# Altium footprint library connectors.PcbLib: 138 footprints (part 8 of 9)
Each footprint in its own frame and in the unit in brackets; x right, y up, seen from the top. Pads: shape width x height; smd on the part's side, far side on the other; paste and mask are expansions set on the pad; w line width, h text height; cw(c..) or ccw(c..) is an arc to the next point about the centre after c.
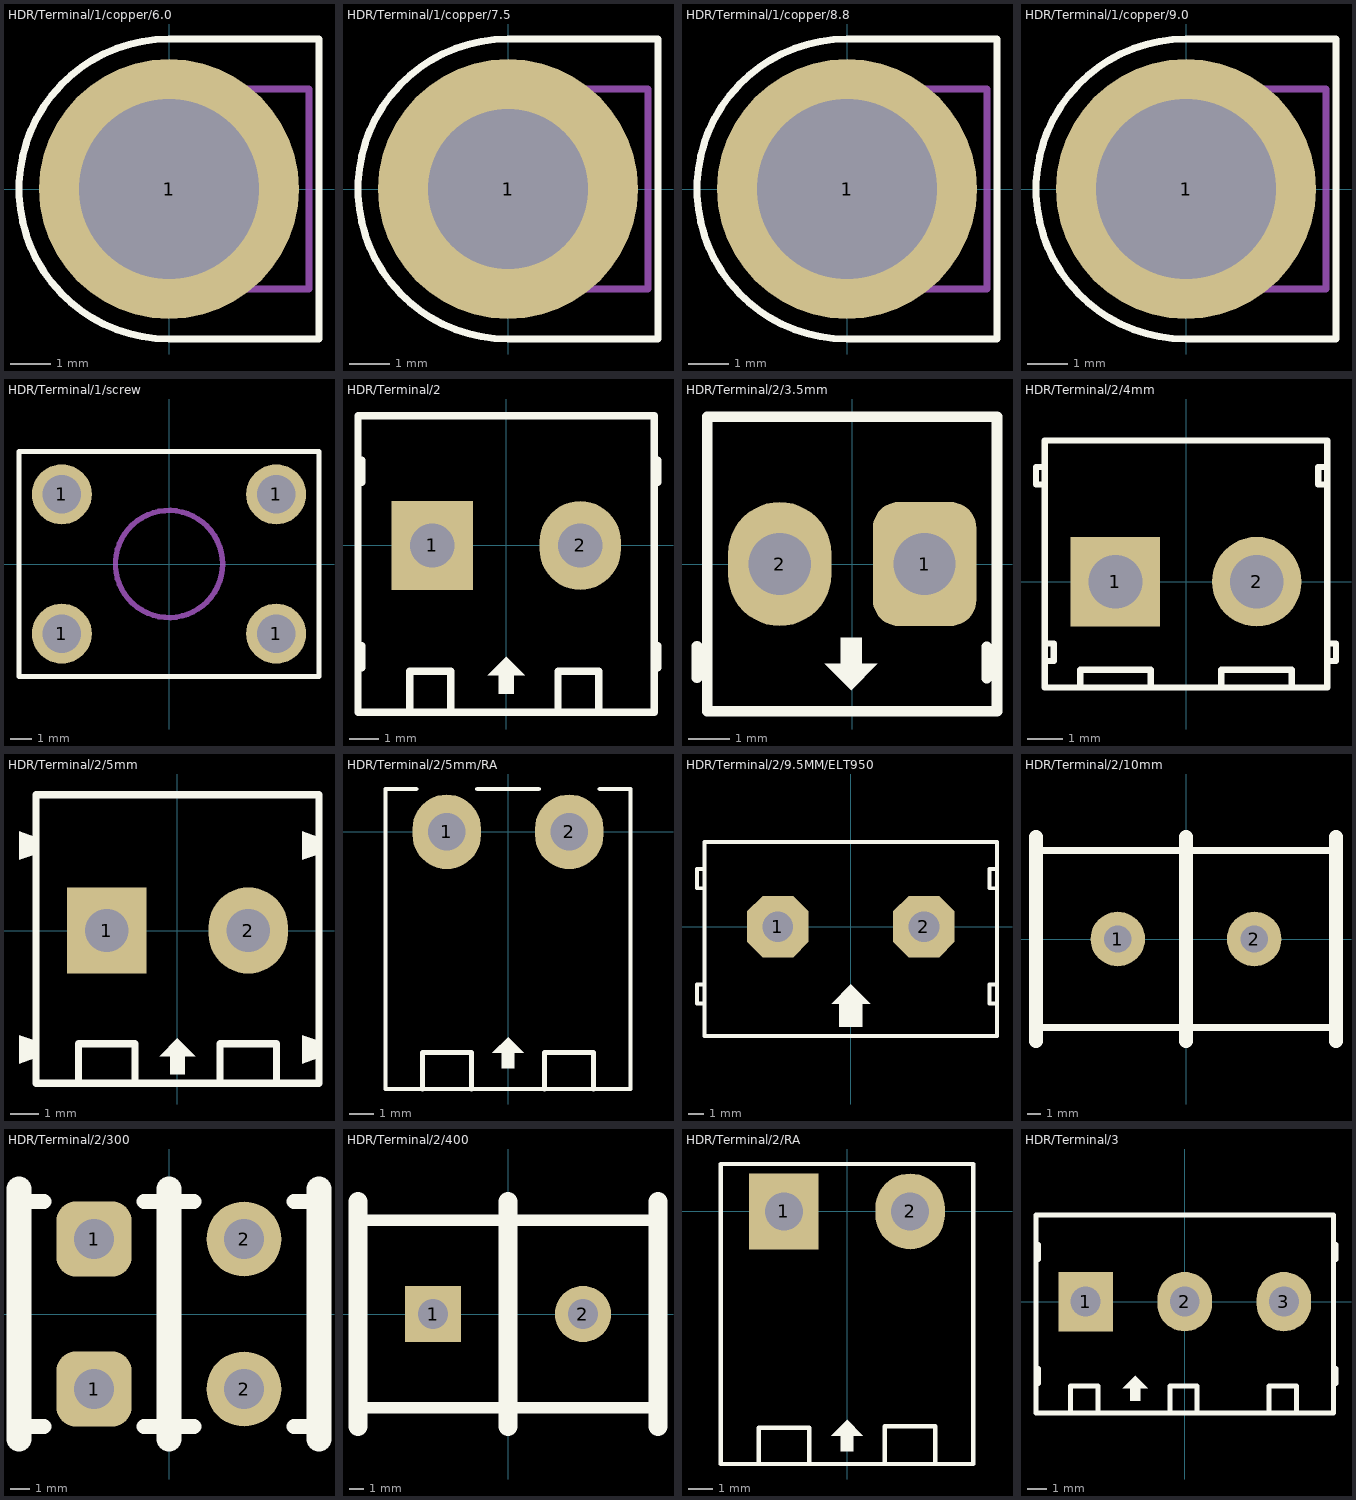
[diagram p7: the footprints below, top view; thin cyan lines are the x and y axes]

## HDR/Terminal/1/copper/6.0 [mm] "Header 1, 1 pin,"
height 7.62
pads (1):
  round 6.5 hole 4.5: 1(0,0)
Top Overlay:
  lines w0.178: 0,-3.75 cw(c0,0) 0,3.75 3.75,3.75 3.75,-3.75 0,-3.75
Mechanical 1:
  lines w0.178: 0.49,-2.451 cw(c0,0) 0.49,2.451 ; 0.5,-2.5 3.5,-2.5 3.5,2.5 0.5,2.5
3D body "terminal2.STEP": height 6, standoff -2, extent -2.5,-2.5 3.5,2.5

## HDR/Terminal/1/copper/7.5 [mm] "Header 1, 1 pin,"
height 7.62
pads (1):
  round 6.5 hole 4: 1(0,0)
Top Overlay:
  lines w0.178: 0,-3.75 cw(c0,0) 0,3.75 3.75,3.75 3.75,-3.75 0,-3.75
Mechanical 1:
  lines w0.178: 0.49,-2.451 cw(c0,0) 0.49,2.451 ; 0.5,-2.5 3.5,-2.5 3.5,2.5 0.5,2.5
3D body "terminal4.STEP": height 7.5, standoff -2, extent -2.5,-2.5 6.5,2.5

## HDR/Terminal/1/copper/8.8 [mm] "Header 1, 1 pin,"
height 7.62
pads (1):
  round 6.5 hole 4.5: 1(0,0)
Top Overlay:
  lines w0.178: 0,-3.75 cw(c0,0) 0,3.75 3.75,3.75 3.75,-3.75 0,-3.75
Mechanical 1:
  lines w0.178: 0.49,-2.451 cw(c0,0) 0.49,2.451 ; 0.5,-2.5 3.5,-2.5 3.5,2.5 0.5,2.5
3D body "terminal3.STEP": height 8.8, standoff -2, extent -2.5,-2.5 3.5,2.5

## HDR/Terminal/1/copper/9.0 [mm] "Header 1, 1 pin,"
height 7.62
pads (1):
  round 6.5 hole 4.5: 1(0,0)
Top Overlay:
  lines w0.178: 0,-3.75 cw(c0,0) 0,3.75 3.75,3.75 3.75,-3.75 0,-3.75
Mechanical 1:
  lines w0.178: 0.49,-2.451 cw(c0,0) 0.49,2.451 ; 0.5,-2.5 3.5,-2.5 3.5,2.5 0.5,2.5
3D body "terminal.STEP": height 9, standoff -2, extent -2.5,-2.5 3.5,2.5

## HDR/Terminal/1/screw [mm]
height 7.62
pads (4):
  round 2.8 hole 1.8: 1(-5,-3.25) 1(-5,3.25) 1(5,-3.25) 1(5,3.25)
Top Overlay:
  lines w0.254: -7,-5.25 -7,5.25 7,5.25 7,-5.25 -7,-5.25
Mechanical 1:
  circle w0.254: c0,0 r2.5
3D body: height 1.5, standoff 0, extent -7,-5.25 -6.25,5.25
3D body: height 4, standoff 0, extent -5.5,-5.25 -4.75,5.25
3D body: height 4, standoff 0, extent -3.75,-5.25 -3,5.25
3D body: height 4, standoff 0, extent -5.375,-5.25 -4.625,5.25
3D body: height 4, standoff 0, extent 4.625,-5.25 5.375,5.25
3D body: height 4.75, standoff 4, extent -5.375,-5.25 0,5.25
3D body: height 4.75, standoff 4, extent 0,-5.25 5.375,5.25

## HDR/Terminal/2 [mil] "Header 2, 2 pin, hight 400mil, Pin to Pin 200mil, Colour Green"
height 300
pads (2):
  rect 110x120 hole 60: 1(-100,0)
  oval 110x120 hole 60: 2(100,0)
Top Overlay:
  region: 0,-150 -25,-175 -10,-175 -10,-200 10,-200 10,-175 25,-175
  lines w10: -195,-165 -195,-135 ; -195,85 -195,115 ; -130,-225 -130,-170 -75,-170 -75,-225 ; 70,-225 70,-170 125,-170 125,-225 ; 205,-165 205,-135 ; 205,85 205,115 ; -200,-225 -200,175 200,175 200,-225 -200,-225
3D body "13989.stp": height 559.05, standoff -137.8, extent -229.17,-217.91 200,167.91

## HDR/Terminal/2/3.5mm [mm]
pads (2):
  rrect50% 2.5x3 hole 1.5: 1(1.75,0)
  oval 2.5x3 hole 1.5: 2(-1.75,0)
Top Overlay:
  region: -0.028,-3.048 0.607,-2.413 0.226,-2.413 0.226,-1.778 -0.282,-1.778 -0.282,-2.413 -0.663,-2.413
  lines w0.254: -3.75,-2.75 -3.75,-1.988 ; 3.25,-2.762 3.25,-2 ; -3.5,-3.556 3.5,-3.556 3.5,3.556 -3.5,3.556 -3.5,-3.556
3D body "User Library-Terminal Block 2 way 3.5mm.step": height 8.51, standoff -3.5, extent -3.556,-3.645 3.556,3.645

## HDR/Terminal/2/4mm [mil]
pads (2):
  rect 100x100 hole 60: 1(-78.8,0)
  round 100 hole 60: 2(78.8,0)
Top Overlay:
  lines w7.01: -157.6,-118.11 -157.6,157.48 157.6,157.48 157.6,-118.11 -157.54,-118.11 ; -157.6,-78.8 -157.6,78.8 ; -157.54,-88.58 -147.7,-88.58 -147.7,-68.9 -157.54,-68.9 ; -157.54,108.27 -167.38,108.27 -167.38,127.95 -157.54,127.95 ; -118.17,-118.11 -118.17,-98.43 -39.43,-98.43 -39.43,-118.11 ; 39.31,-118.11 39.31,-98.43 118.05,-98.43 118.05,-118.11 ; 157.42,-88.58 167.26,-88.58 167.26,-68.9 157.42,-68.9 ; 157.42,108.27 147.58,108.27 147.58,127.95 157.42,127.95 ; 157.6,-78.8 157.6,78.8

## HDR/Terminal/2/5mm [mil] "Header 2, 2 pin, hight 400mil, Pin to Pin 200mil, Colour Green"
height 300
pads (2):
  rect 110x120 hole 60: 1(-98.43,0)
  oval 110x120 hole 60: 2(98.43,0)
Top Overlay:
  region: 0,-150 -25,-175 -10,-175 -10,-200 10,-200 10,-175 25,-175
  region: -220.47,98.43 -220.47,137.8 -196.85,129.92 -196.85,106.3
  region: -220.47,-185.04 -220.47,-145.67 -196.85,-153.54 -196.85,-177.17
  region: 173.23,-185.04 173.23,-145.67 196.85,-153.54 196.85,-177.17
  region: 173.23,98.43 173.23,137.8 196.85,129.92 196.85,106.3
  lines w10: -137.8,-212.6 -137.8,-157.48 -59.06,-157.48 -59.06,-212.6 ; 59.06,-212.6 59.06,-157.48 137.8,-157.48 137.8,-212.6 ; -196.85,-212.6 -196.85,188.98 196.85,188.98 196.85,-212.6 -196.85,-212.6
3D body "terminal_blocks_a-tb500-ti02.stp": height 559.07, standoff -137.8, extent -220.47,-214.57 196.85,190.95

## HDR/Terminal/2/5mm/RA [mil] "Header 2, 2 pin, hight 300mil, Pin to Pin 200, Colour Green"
height 300
pads (2):
  oval 110x120 hole 60: 1(-98.43,0) 2(98.43,0)
Top Overlay:
  region: 0,-330 -25,-355 -10,-355 -10,-380 10,-380 10,-355 25,-355
  lines w7: -147.64,68.9 -196.85,68.9 -196.85,-413.39 196.85,-413.39 196.85,68.9 147.64,68.9 ; -49.21,68.9 49.21,68.9
  lines w8: -137.8,-413.39 -137.8,-354.33 -59.06,-354.33 -59.06,-413.39 ; 59.06,-413.39 59.06,-354.33 137.8,-354.33 137.8,-413.39
3D body "User Library-5EHDR_2P.step": height 333.51, standoff -157.48, extent -196.85,-403.54 196.85,68.9

## HDR/Terminal/2/9.5MM/ELT950 [mm] "ELT950-9.5mm-2P"
pads (2):
  oct 4x4 hole 2: 1(-4.75,0) 2(4.75,0)
Top Overlay:
  region: -0.75,-6.5 0.75,-6.5 0.75,-5 1.25,-5 0,-3.75 -1.25,-5 -0.75,-5
  lines w0.254: -9.5,-5 -10,-5 -10,-3.75 -9.5,-3.75 ; -9.5,2.5 -10,2.5 -10,3.75 -9.5,3.75 ; 9.5,-5 9,-5 9,-3.75 9.5,-3.75 ; 9.5,2.5 9,2.5 9,3.75 9.5,3.75 ; -9.5,-7.1 9.5,-7.1 9.5,5.5 -9.5,5.5 -9.5,-7.1
3D body "37750.stp": height 21.5, standoff -5, extent -10.11,-7 9.5,5.5

## HDR/Terminal/2/10mm [mm]
pads (2):
  round 4 hole 2: 1(-5,0) 2(5,0)
Top Overlay:
  lines w0.5: -11,-6.5 11,-6.5 ; -11,6.5 11,6.5
  lines w1: -11,-7.5 -11,7.5 ; 0,-7.5 0,7.5 ; 11,-7.5 11,7.5
3D body "User Library-Terminal_Block.step": height 18.14, standoff -5.36, extent -11,-7.75 11,7.75

## HDR/Terminal/2/300 [mil]
pads (4):
  rrect50% 150x150 hole 80: 1(-150,-150) 1(-150,150)
  round 150 hole 80: 2(150,-150) 2(150,150)
Top Overlay:
  lines w30: -275,-225 -250,-225 ; -275,225 -250,225 ; -50,-225 -25,-225 ; -50,225 -25,225 ; 25,-225 50,-225 ; 25,225 50,225 ; 250,-225 275,-225 ; 250,225 275,225
  lines w50: -300,-250 -300,250 ; 0,-250 0,250 ; 300,-250 300,250
3D body: height 250, standoff 0, extent -300,-225 300,225
3D body: height 500, standoff 0, extent -300,-250 -275,250
3D body: height 500, standoff 0, extent -25,-250 25,250
3D body: height 500, standoff 0, extent 275,-250 300,250
3D body: height 300, standoff 250, extent -265,-135 -35,135
3D body: height 300, standoff 250, extent 35,-135 265,135
3D body: height 380, standoff 300, extent -249.21,-99.8 -50,99.8
3D body: height 380, standoff 300, extent 50.79,-99.8 250,99.8

## HDR/Terminal/2/400 [mil]
pads (2):
  rect 150x150 hole 80: 1(-200,0)
  round 150 hole 80: 2(200,0)
Top Overlay:
  lines w30: -400,-250 400,-250 ; -400,250 400,250
  lines w50: -400,-300 -400,300 ; 0,-300 0,300 ; 400,-300 400,300
3D body "User Library-Terminal_Block.step": height 714.05, standoff -211.15, extent -433.07,-305.12 433.07,305.12

## HDR/Terminal/2/RA [mil] "Header 2, 2 pin, hight 300mil, Pin to Pin 200, Colour Green"
height 300
pads (2):
  rect 110x120 hole 60: 1(-100,0)
  oval 110x120 hole 60: 2(100,0)
Top Overlay:
  region: 0,-330 -25,-355 -10,-355 -10,-380 10,-380 10,-355 25,-355
  lines w7: -140,-400 -140,-342.5 -60,-342.5 -60,-400 ; 60,-400 60,-340 140,-340 140,-400 ; -200,-400 200,-400 200,-15 200,15 200,75 -200,75 -200,-400
3D body "User Library-BigHeader 5EHDR_1P.step": height 334.11, standoff -156.88, extent -190,-402.44 6.85,70
3D body "User Library-BigHeader 5EHDR_1P.step": height 334.11, standoff -156.88, extent 5,-402.44 201.85,70

## HDR/Terminal/3 [mil]
height 300
pads (3):
  rect 110x120 hole 60: 1(-200,0)
  oval 110x120 hole 60: 2(0,0) 3(200,0)
Top Overlay:
  region: -100,-150 -125,-175 -110,-175 -110,-200 -90,-200 -90,-175 -75,-175
  lines w10: -295,-165 -295,-135 ; -295,85 -295,115 ; -230,-225 -230,-170 -175,-170 -175,-225 ; -30,-225 -30,-170 25,-170 25,-225 ; 170,-225 170,-170 225,-170 225,-225 ; 305,-165 305,-135 ; 305,85 305,115 ; -300,-225 300,-225 300,175 -300,175 -300,-225
3D body "13989.stp": height 559.05, standoff -137.8, extent -129.17,-217.91 300,167.91
3D body "13989.stp": height 559.05, standoff -137.8, extent -329.17,-217.91 100,167.91